# Altium footprint library microbuilder.PCBLIB: 422 footprints (part 24 of 27)
Each footprint in its own frame and in the unit in brackets; x right, y up, seen from the top. Pads: shape width x height; smd on the part's side, far side on the other; paste and mask are expansions set on the pad; w line width, h text height; cw(c..) or ccw(c..) is an arc to the next point about the centre after c.
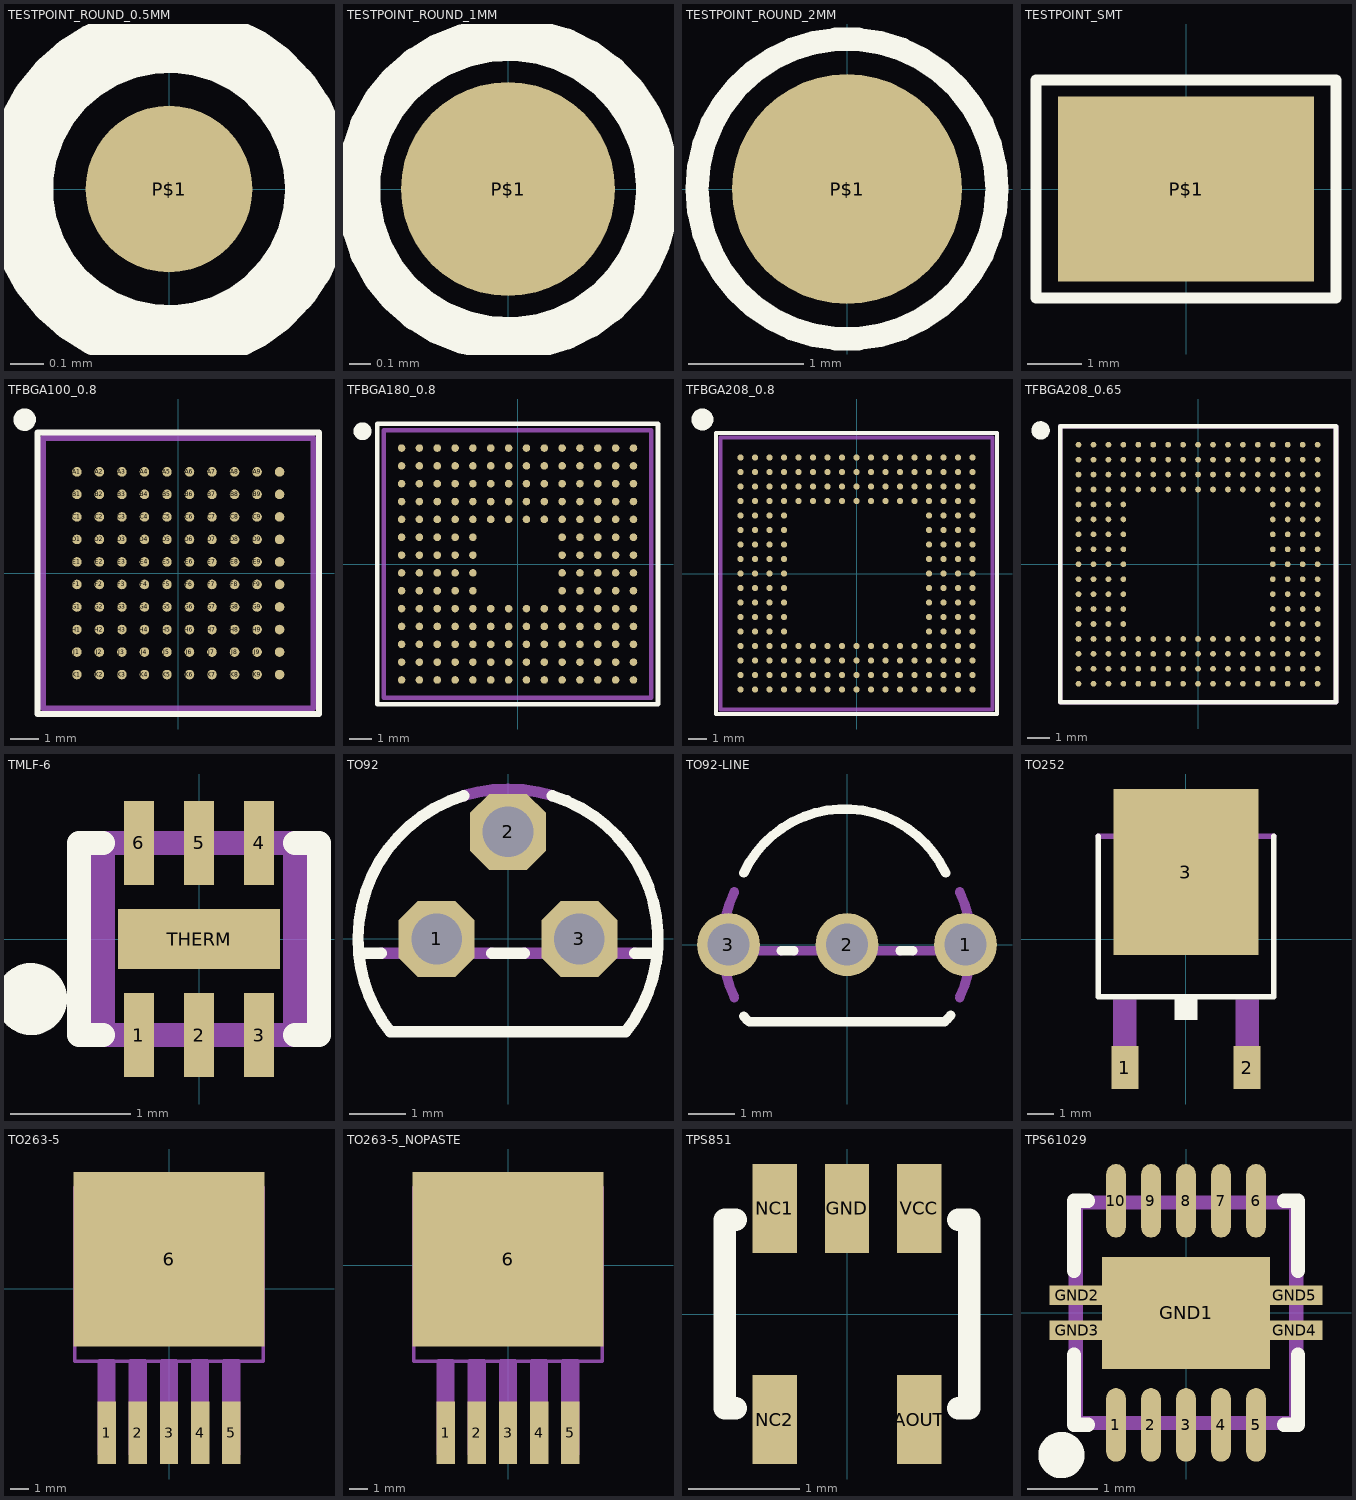
[diagram p23: the footprints below, top view; thin cyan lines are the x and y axes]

## TESTPOINT_ROUND_0.5MM [mm]
pads (1):
  rrect100% 0.5x0.5 smd: P$1(0,0)
Top Overlay:
  circle w0.203: c0,0 r0.45

## TESTPOINT_ROUND_1MM [mm]
pads (1):
  rrect100% 1x1 smd: P$1(0,0)
Top Overlay:
  circle w0.203: c0,0 r0.7

## TESTPOINT_ROUND_2MM [mm]
pads (1):
  rrect100% 2x2 smd: P$1(0,0)
Top Overlay:
  circle w0.203: c0,0 r1.303

## TESTPOINT_SMT [mm]
pads (1):
  rect 4.7x3.4 smd: P$1(0,0)
Top Overlay:
  lines w0.203: -2.75,-2 -2.75,2 2.75,2 2.75,-2 -2.75,-2

## TFBGA100_0.8 [mm]
pads (100):
  rrect100% 0.34x0.34 smd: A1(-3.6,3.6) A2(-2.8,3.6) A3(-2,3.6) A4(-1.2,3.6) A5(-0.4,3.6) A6(0.4,3.6) A7(1.2,3.6) A8(2,3.6) A9(2.8,3.6) A10(3.6,3.6) B1(-3.6,2.8) B2(-2.8,2.8) B3(-2,2.8) B4(-1.2,2.8) B5(-0.4,2.8) B6(0.4,2.8) B7(1.2,2.8) B8(2,2.8) B9(2.8,2.8) B10(3.6,2.8) C1(-3.6,2) C2(-2.8,2) C3(-2,2) C4(-1.2,2) C5(-0.4,2) C6(0.4,2) C7(1.2,2) C8(2,2) C9(2.8,2) C10(3.6,2) D1(-3.6,1.2) D2(-2.8,1.2) D3(-2,1.2) D4(-1.2,1.2) D5(-0.4,1.2) D6(0.4,1.2) D7(1.2,1.2) D8(2,1.2) D9(2.8,1.2) D10(3.6,1.2) E1(-3.6,0.4) E2(-2.8,0.4) E3(-2,0.4) E4(-1.2,0.4) E5(-0.4,0.4) E6(0.4,0.4) E7(1.2,0.4) E8(2,0.4) E9(2.8,0.4) E10(3.6,0.4) F1(-3.6,-0.4) F2(-2.8,-0.4) F3(-2,-0.4) F4(-1.2,-0.4) F5(-0.4,-0.4) F6(0.4,-0.4) F7(1.2,-0.4) F8(2,-0.4) F9(2.8,-0.4) F10(3.6,-0.4) G1(-3.6,-1.2) G2(-2.8,-1.2) G3(-2,-1.2) G4(-1.2,-1.2) G5(-0.4,-1.2) G6(0.4,-1.2) G7(1.2,-1.2) G8(2,-1.2) G9(2.8,-1.2) G10(3.6,-1.2) H1(-3.6,-2) H2(-2.8,-2) H3(-2,-2) H4(-1.2,-2) H5(-0.4,-2) H6(0.4,-2) H7(1.2,-2) H8(2,-2) H9(2.8,-2) H10(3.6,-2) J1(-3.6,-2.8) J2(-2.8,-2.8) J3(-2,-2.8) J4(-1.2,-2.8) J5(-0.4,-2.8) J6(0.4,-2.8) J7(1.2,-2.8) J8(2,-2.8) J9(2.8,-2.8) J10(3.6,-2.8) K1(-3.6,-3.6) K2(-2.8,-3.6) K3(-2,-3.6) K4(-1.2,-3.6) K5(-0.4,-3.6) K6(0.4,-3.6) K7(1.2,-3.6) K8(2,-3.6) K9(2.8,-3.6) K10(3.6,-3.6)
Top Overlay:
  circle w0.4: c-5.454,5.454 r0.2
  lines w0.203: -5,-5 -5,5 5,5 5,-5 -5,-5
Mechanical 14:
  text "A" at -5.55,3.45 h0.63
  text "1" at -3.8,5.4 h0.63
  text "B" at -5.55,2.65 h0.63
  text "C" at -5.55,1.85 h0.63
  text "D" at -5.55,1.05 h0.63
  text "E" at -5.55,0.25 h0.63
  text "F" at -5.55,-0.55 h0.63
  text "G" at -5.55,-1.35 h0.63
  text "H" at -5.55,-2.15 h0.63
  text "J" at -5.55,-2.95 h0.63
  text "K" at -5.55,-3.75 h0.63
  text "2" at -3,5.4 h0.63
  text "3" at -2.2,5.4 h0.63
  text "4" at -1.4,5.4 h0.63
  text "5" at -0.6,5.4 h0.63
  text "6" at 0.2,5.4 h0.63
  text "7" at 1,5.4 h0.63
  text "8" at 1.8,5.4 h0.63
  text "9" at 2.6,5.4 h0.63
  text "10" at 3.4,5.4 h0.63
Mechanical 16:
  lines w0.203: -4.8,-4.8 -4.8,4.8 4.8,4.8 4.8,-4.8 -4.8,-4.8

## TFBGA180_0.8 [mm]
pads (180):
  rrect100% 0.34x0.34 smd: A1(-5.2,5.2) A2(-4.4,5.2) A3(-3.6,5.2) A4(-2.8,5.2) A5(-2,5.2) A6(-1.2,5.2) A7(-0.4,5.2) A8(0.4,5.2) A9(1.2,5.2) A10(2,5.2) A11(2.8,5.2) A12(3.6,5.2) A13(4.4,5.2) A14(5.2,5.2) B1(-5.2,4.4) B2(-4.4,4.4) B3(-3.6,4.4) B4(-2.8,4.4) B5(-2,4.4) B6(-1.2,4.4) B7(-0.4,4.4) B8(0.4,4.4) B9(1.2,4.4) B10(2,4.4) B11(2.8,4.4) B12(3.6,4.4) B13(4.4,4.4) B14(5.2,4.4) C1(-5.2,3.6) C2(-4.4,3.6) C3(-3.6,3.6) C4(-2.8,3.6) C5(-2,3.6) C6(-1.2,3.6) C7(-0.4,3.6) C8(0.4,3.6) C9(1.2,3.6) C10(2,3.6) C11(2.8,3.6) C12(3.6,3.6) C13(4.4,3.6) C14(5.2,3.6) D1(-5.2,2.8) D2(-4.4,2.8) D3(-3.6,2.8) D4(-2.8,2.8) D5(-2,2.8) D6(-1.2,2.8) D7(-0.4,2.8) D8(0.4,2.8) D9(1.2,2.8) D10(2,2.8) D11(2.8,2.8) D12(3.6,2.8) D13(4.4,2.8) D14(5.2,2.8) E1(-5.2,2) E2(-4.4,2) E3(-3.6,2) E4(-2.8,2) E5(-2,2) E6(-1.2,2) E7(-0.4,2) E8(0.4,2) E9(1.2,2) E10(2,2) E11(2.8,2) E12(3.6,2) E13(4.4,2) E14(5.2,2) F1(-5.2,1.2) F2(-4.4,1.2) F3(-3.6,1.2) F4(-2.8,1.2) F5(-2,1.2) F10(2,1.2) F11(2.8,1.2) F12(3.6,1.2) F13(4.4,1.2) F14(5.2,1.2) G1(-5.2,0.4) G2(-4.4,0.4) G3(-3.6,0.4) G4(-2.8,0.4) G5(-2,0.4) G10(2,0.4) G11(2.8,0.4) G12(3.6,0.4) G13(4.4,0.4) G14(5.2,0.4) H1(-5.2,-0.4) H2(-4.4,-0.4) H3(-3.6,-0.4) H4(-2.8,-0.4) H5(-2,-0.4) H10(2,-0.4) H11(2.8,-0.4) H12(3.6,-0.4) H13(4.4,-0.4) H14(5.2,-0.4) J1(-5.2,-1.2) J2(-4.4,-1.2) J3(-3.6,-1.2) J4(-2.8,-1.2) J5(-2,-1.2) J10(2,-1.2) J11(2.8,-1.2) J12(3.6,-1.2) J13(4.4,-1.2) J14(5.2,-1.2) K1(-5.2,-2) K2(-4.4,-2) K3(-3.6,-2) K4(-2.8,-2) K5(-2,-2) K6(-1.2,-2) K7(-0.4,-2) K8(0.4,-2) K9(1.2,-2) K10(2,-2) K11(2.8,-2) K12(3.6,-2) K13(4.4,-2) K14(5.2,-2) L1(-5.2,-2.8) L2(-4.4,-2.8) L3(-3.6,-2.8) L4(-2.8,-2.8) L5(-2,-2.8) L6(-1.2,-2.8) L7(-0.4,-2.8) L8(0.4,-2.8) L9(1.2,-2.8) L10(2,-2.8) L11(2.8,-2.8) L12(3.6,-2.8) L13(4.4,-2.8) L14(5.2,-2.8) M1(-5.2,-3.6) M2(-4.4,-3.6) M3(-3.6,-3.6) M4(-2.8,-3.6) M5(-2,-3.6) M6(-1.2,-3.6) M7(-0.4,-3.6) M8(0.4,-3.6) M9(1.2,-3.6) M10(2,-3.6) M11(2.8,-3.6) M12(3.6,-3.6) M13(4.4,-3.6) M14(5.2,-3.6) N1(-5.2,-4.4) N2(-4.4,-4.4) N3(-3.6,-4.4) N4(-2.8,-4.4) N5(-2,-4.4) N6(-1.2,-4.4) N7(-0.4,-4.4) N8(0.4,-4.4) N9(1.2,-4.4) N10(2,-4.4) N11(2.8,-4.4) N12(3.6,-4.4) N13(4.4,-4.4) N14(5.2,-4.4) P1(-5.2,-5.2) P2(-4.4,-5.2) P3(-3.6,-5.2) P4(-2.8,-5.2) P5(-2,-5.2) P6(-1.2,-5.2) P7(-0.4,-5.2) P8(0.4,-5.2) P9(1.2,-5.2) P10(2,-5.2) P11(2.8,-5.2) P12(3.6,-5.2) P13(4.4,-5.2) P14(5.2,-5.2)
Top Overlay:
  circle w0.4: c-6.954,5.954 r0.2
  lines w0.203: -6.3,-6.3 6.3,-6.3 6.3,6.3 -6.3,6.3 -6.3,-6.3
Mechanical 14:
  text "A" at -6.8,5 h0.63
  text "B" at -6.8,4.2 h0.63
  text "C" at -6.8,3.4 h0.63
  text "D" at -6.8,2.6 h0.63
  text "E" at -6.8,1.8 h0.63
  text "F" at -6.8,1 h0.63
  text "G" at -6.8,0.2 h0.63
  text "H" at -6.8,-0.6 h0.63
  text "J" at -6.8,-1.4 h0.63
  text "K" at -6.8,-2.2 h0.63
  text "L" at -6.8,-3 h0.63
  text "M" at -6.8,-3.8 h0.63
  text "N" at -6.8,-4.6 h0.63
  text "P" at -6.8,-5.4 h0.63
  text "1" at -5.4,6.4 h0.63
  text "2" at -4.6,6.4 h0.63
  text "3" at -3.8,6.4 h0.63
  text "4" at -3,6.4 h0.63
  text "5" at -2.2,6.4 h0.63
  text "6" at -1.4,6.4 h0.63
  text "7" at -0.6,6.4 h0.63
  text "8" at 0.2,6.4 h0.63
  text "9" at 1,6.4 h0.63
  text "10" at 1.8,6.4 h0.63
  text "11" at 2.6,6.4 h0.63
  text "12" at 3.4,6.4 h0.63
  text "13" at 4.2,6.4 h0.63
  text "14" at 5,6.4 h0.63
Mechanical 16:
  lines w0.203: -6,-6 6,-6 6,6 -6,6 -6,-6

## TFBGA208_0.8 [mm]
pads (208):
  rrect100% 0.34x0.34 smd: A1(-6.4,6.4) A2(-5.6,6.4) A3(-4.8,6.4) A4(-4,6.4) A5(-3.2,6.4) A6(-2.4,6.4) A7(-1.6,6.4) A8(-0.8,6.4) A9(0,6.4) A10(0.8,6.4) A11(1.6,6.4) A12(2.4,6.4) A13(3.2,6.4) A14(4,6.4) A15(4.8,6.4) A16(5.6,6.4) A17(6.4,6.4) B1(-6.4,5.6) B2(-5.6,5.6) B3(-4.8,5.6) B4(-4,5.6) B5(-3.2,5.6) B6(-2.4,5.6) B7(-1.6,5.6) B8(-0.8,5.6) B9(0,5.6) B10(0.8,5.6) B11(1.6,5.6) B12(2.4,5.6) B13(3.2,5.6) B14(4,5.6) B15(4.8,5.6) B16(5.6,5.6) B17(6.4,5.6) C1(-6.4,4.8) C2(-5.6,4.8) C3(-4.8,4.8) C4(-4,4.8) C5(-3.2,4.8) C6(-2.4,4.8) C7(-1.6,4.8) C8(-0.8,4.8) C9(0,4.8) C10(0.8,4.8) C11(1.6,4.8) C12(2.4,4.8) C13(3.2,4.8) C14(4,4.8) C15(4.8,4.8) C16(5.6,4.8) C17(6.4,4.8) D1(-6.4,4) D2(-5.6,4) D3(-4.8,4) D4(-4,4) D5(-3.2,4) D6(-2.4,4) D7(-1.6,4) D8(-0.8,4) D9(0,4) D10(0.8,4) D11(1.6,4) D12(2.4,4) D13(3.2,4) D14(4,4) D15(4.8,4) D16(5.6,4) D17(6.4,4) E1(-6.4,3.2) E2(-5.6,3.2) E3(-4.8,3.2) E4(-4,3.2) E14(4,3.2) E15(4.8,3.2) E16(5.6,3.2) E17(6.4,3.2) F1(-6.4,2.4) F2(-5.6,2.4) F3(-4.8,2.4) F4(-4,2.4) F14(4,2.4) F15(4.8,2.4) F16(5.6,2.4) F17(6.4,2.4) G1(-6.4,1.6) G2(-5.6,1.6) G3(-4.8,1.6) G4(-4,1.6) G14(4,1.6) G15(4.8,1.6) G16(5.6,1.6) G17(6.4,1.6) H1(-6.4,0.8) H2(-5.6,0.8) H3(-4.8,0.8) H4(-4,0.8) H14(4,0.8) H15(4.8,0.8) H16(5.6,0.8) H17(6.4,0.8) J1(-6.4,0) J2(-5.6,0) J3(-4.8,0) J4(-4,0) J14(4,0) J15(4.8,0) J16(5.6,0) J17(6.4,0) K1(-6.4,-0.8) K2(-5.6,-0.8) K3(-4.8,-0.8) K4(-4,-0.8) K14(4,-0.8) K15(4.8,-0.8) K16(5.6,-0.8) K17(6.4,-0.8) L1(-6.4,-1.6) L2(-5.6,-1.6) L3(-4.8,-1.6) L4(-4,-1.6) L14(4,-1.6) L15(4.8,-1.6) L16(5.6,-1.6) L17(6.4,-1.6) M1(-6.4,-2.4) M2(-5.6,-2.4) M3(-4.8,-2.4) M4(-4,-2.4) M14(4,-2.4) M15(4.8,-2.4) M16(5.6,-2.4) M17(6.4,-2.4) N1(-6.4,-3.2) N2(-5.6,-3.2) N3(-4.8,-3.2) N4(-4,-3.2) N14(4,-3.2) N15(4.8,-3.2) N16(5.6,-3.2) N17(6.4,-3.2) P1(-6.4,-4) P2(-5.6,-4) P3(-4.8,-4) P4(-4,-4) P5(-3.2,-4) P6(-2.4,-4) P7(-1.6,-4) P8(-0.8,-4) P9(0,-4) P10(0.8,-4) P11(1.6,-4) P12(2.4,-4) P13(3.2,-4) P14(4,-4) P15(4.8,-4) P16(5.6,-4) P17(6.4,-4) R1(-6.4,-4.8) R2(-5.6,-4.8) R3(-4.8,-4.8) R4(-4,-4.8) R5(-3.2,-4.8) R6(-2.4,-4.8) R7(-1.6,-4.8) R8(-0.8,-4.8) R9(0,-4.8) R10(0.8,-4.8) R11(1.6,-4.8) R12(2.4,-4.8) R13(3.2,-4.8) R14(4,-4.8) R15(4.8,-4.8) R16(5.6,-4.8) R17(6.4,-4.8) T1(-6.4,-5.6) T2(-5.6,-5.6) T3(-4.8,-5.6) T4(-4,-5.6) T5(-3.2,-5.6) T6(-2.4,-5.6) T7(-1.6,-5.6) T8(-0.8,-5.6) T9(0,-5.6) T10(0.8,-5.6) T11(1.6,-5.6) T12(2.4,-5.6) T13(3.2,-5.6) T14(4,-5.6) T15(4.8,-5.6) T16(5.6,-5.6) T17(6.4,-5.6) U1(-6.4,-6.4) U2(-5.6,-6.4) U3(-4.8,-6.4) U4(-4,-6.4) U5(-3.2,-6.4) U6(-2.4,-6.4) U7(-1.6,-6.4) U8(-0.8,-6.4) U9(0,-6.4) U10(0.8,-6.4) U11(1.6,-6.4) U12(2.4,-6.4) U13(3.2,-6.4) U14(4,-6.4) U15(4.8,-6.4) U16(5.6,-6.4) U17(6.4,-6.4)
Top Overlay:
  circle w0.61: c-8.5,8.5 r0.3
  lines w0.203: -7.75,-7.75 -7.75,7.75 7.75,7.75 7.75,-7.75 -7.75,-7.75
Mechanical 16:
  lines w0.203: -7.5,-7.5 -7.5,7.5 7.5,7.5 7.5,-7.5 -7.5,-7.5

## TFBGA208_0.65 [mm]
pads (208):
  rrect100% 0.25x0.25 smd: 15(3.9,-1.95) A1(-5.2,5.2) A2(-4.55,5.2) A3(-3.9,5.2) A4(-3.25,5.2) A5(-2.6,5.2) A6(-1.95,5.2) A7(-1.3,5.2) A8(-0.65,5.2) A9(0,5.2) A10(0.65,5.2) A11(1.3,5.2) A12(1.95,5.2) A13(2.6,5.2) A14(3.25,5.2) A15(3.9,5.2) A16(4.55,5.2) A17(5.2,5.2) B1(-5.2,4.55) B2(-4.55,4.55) B3(-3.9,4.55) B4(-3.25,4.55) B5(-2.6,4.55) B6(-1.95,4.55) B7(-1.3,4.55) B8(-0.65,4.55) B9(0,4.55) B10(0.65,4.55) B11(1.3,4.55) B12(1.95,4.55) B13(2.6,4.55) B14(3.25,4.55) B15(3.9,4.55) B16(4.55,4.55) B17(5.2,4.55) C1(-5.2,3.9) C2(-4.55,3.9) C3(-3.9,3.9) C4(-3.25,3.9) C5(-2.6,3.9) C6(-1.95,3.9) C7(-1.3,3.9) C8(-0.65,3.9) C9(0,3.9) C10(0.65,3.9) C11(1.3,3.9) C12(1.95,3.9) C13(2.6,3.9) C14(3.25,3.9) C15(3.9,3.9) C16(4.55,3.9) C17(5.2,3.9) D1(-5.2,3.25) D2(-4.55,3.25) D3(-3.9,3.25) D4(-3.25,3.25) D5(-2.6,3.25) D6(-1.95,3.25) D7(-1.3,3.25) D8(-0.65,3.25) D9(0,3.25) D10(0.65,3.25) D11(1.3,3.25) D12(1.95,3.25) D13(2.6,3.25) D14(3.25,3.25) D15(3.9,3.25) D16(4.55,3.25) D17(5.2,3.25) E1(-5.2,2.6) E2(-4.55,2.6) E3(-3.9,2.6) E4(-3.25,2.6) E14(3.25,2.6) E15(3.9,2.6) E16(4.55,2.6) E17(5.2,2.6) F1(-5.2,1.95) F2(-4.55,1.95) F3(-3.9,1.95) F4(-3.25,1.95) F14(3.25,1.95) F15(3.9,1.95) F16(4.55,1.95) F17(5.2,1.95) G1(-5.2,1.3) G2(-4.55,1.3) G3(-3.9,1.3) G4(-3.25,1.3) G14(3.25,1.3) G15(3.9,1.3) G16(4.55,1.3) G17(5.2,1.3) H1(-5.2,0.65) H2(-4.55,0.65) H3(-3.9,0.65) H4(-3.25,0.65) H14(3.25,0.65) H15(3.9,0.65) H16(4.55,0.65) H17(5.2,0.65) J1(-5.2,0) J2(-4.55,0) J3(-3.9,0) J4(-3.25,0) J14(3.25,0) J15(3.9,0) J16(4.55,0) J17(5.2,0) K1(-5.2,-0.65) K1'(3.25,-0.65) K2(-4.55,-0.65) K3(-3.9,-0.65) K4(-3.25,-0.65) K15(3.9,-0.65) K16(4.55,-0.65) K17(5.2,-0.65) L1(-5.2,-1.3) L2(-4.55,-1.3) L3(-3.9,-1.3) L4(-3.25,-1.3) L14(3.25,-1.3) L15(3.9,-1.3) L16(4.55,-1.3) L17(5.2,-1.3) M1(-5.2,-1.95) M2(-4.55,-1.95) M3(-3.9,-1.95) M4(-3.25,-1.95) M14(3.25,-1.95) M16(4.55,-1.95) M17(5.2,-1.95) N1(-5.2,-2.6) N2(-4.55,-2.6) N3(-3.9,-2.6) N4(-3.25,-2.6) N14(3.25,-2.6) N15(3.9,-2.6) N16(4.55,-2.6) N17(5.2,-2.6) P1(-5.2,-3.25) P2(-4.55,-3.25) P3(-3.9,-3.25) P4(-3.25,-3.25) P5(-2.6,-3.25) P6(-1.95,-3.25) P7(-1.3,-3.25) P8(-0.65,-3.25) P9(0,-3.25) P10(0.65,-3.25) P11(1.3,-3.25) P12(1.95,-3.25) P13(2.6,-3.25) P14(3.25,-3.25) P15(3.9,-3.25) P16(4.55,-3.25) P17(5.2,-3.25) R1(-5.2,-3.9) R2(-4.55,-3.9) R3(-3.9,-3.9) R4(-3.25,-3.9) R5(-2.6,-3.9) R6(-1.95,-3.9) R7(-1.3,-3.9) R8(-0.65,-3.9) R9(0,-3.9) R10(0.65,-3.9) R11(1.3,-3.9) R12(1.95,-3.9) R13(2.6,-3.9) R14(3.25,-3.9) R15(3.9,-3.9) R16(4.55,-3.9) R17(5.2,-3.9) T1(-5.2,-4.55) T2(-4.55,-4.55) T3(-3.9,-4.55) T4(-3.25,-4.55) T5(-2.6,-4.55) T6(-1.95,-4.55) T7(-1.3,-4.55) T8(-0.65,-4.55) T9(0,-4.55) T10(0.65,-4.55) T11(1.3,-4.55) T12(1.95,-4.55) T13(2.6,-4.55) T14(3.25,-4.55) T15(3.9,-4.55) T16(4.55,-4.55) T17(5.2,-4.55) U1(-5.2,-5.2) U2(-4.55,-5.2) U3(-3.9,-5.2) U4(-3.25,-5.2) U5(-2.6,-5.2) U6(-1.95,-5.2) U7(-1.3,-5.2) U8(-0.65,-5.2) U9(0,-5.2) U10(0.65,-5.2) U11(1.3,-5.2) U12(1.95,-5.2) U13(2.6,-5.2) U14(3.25,-5.2) U15(3.9,-5.2) U16(4.55,-5.2) U17(5.2,-5.2)
Top Overlay:
  circle w0.4: c-6.85,5.82 r0.2
  lines w0.203: -6,-6 -6,6 6,6 6,-6 -6,-6
Mechanical 14:
  text "17" at 4.875,6.338 h0.63
  text "16" at 4.225,6.338 h0.63
  text "15" at 3.575,6.338 h0.63
  text "14" at 2.925,6.338 h0.63
  text "13" at 2.275,6.338 h0.63
  text "12" at 1.625,6.338 h0.63
  text "11" at 0.975,6.338 h0.63
  text "10" at 0.325,6.338 h0.63
  text "9" at -0.163,6.338 h0.63
  text "8" at -0.813,6.338 h0.63
  text "7" at -1.463,6.338 h0.63
  text "6" at -2.113,6.338 h0.63
  text "5" at -2.763,6.338 h0.63
  text "4" at -3.412,6.338 h0.63
  text "3" at -4.062,6.338 h0.63
  text "2" at -4.712,6.338 h0.63
  text "1" at -5.362,6.338 h0.63
  text "U" at -6.662,-5.362 h0.63
  text "T" at -6.662,-4.712 h0.63
  text "R" at -6.662,-4.062 h0.63
  text "P" at -6.662,-3.412 h0.63
  text "N" at -6.662,-2.763 h0.63
  text "M" at -6.662,-2.113 h0.63
  text "L" at -6.662,-1.463 h0.63
  text "K" at -6.662,-0.813 h0.63
  text "J" at -6.662,-0.163 h0.63
  text "H" at -6.662,0.487 h0.63
  text "G" at -6.662,1.137 h0.63
  text "F" at -6.662,1.787 h0.63
  text "E" at -6.662,2.437 h0.63
  text "D" at -6.662,3.088 h0.63
  text "C" at -6.662,3.738 h0.63
  text "B" at -6.662,4.388 h0.63
  text "A" at -6.662,5.038 h0.63
Mechanical 16:
  lines w0.203: -6,-6 -6,6 6,6 6,-6 -6,-6

## TMLF-6 [mil]
pads (7):
  rect 9.84x27.56 smd: 1(-19.69,-31.5) 2(0,-31.5) 3(19.69,-31.5) 4(19.69,31.5) 5(0,31.5) 6(-19.69,31.5)
  rect 53.15x19.69 smd: THERM(0,0)
Top Overlay:
  circle w15.75: c-55.12,-19.69 r3.94
  lines w8: -31.5,-31.5 -39.37,-31.5 -39.37,31.5 -31.5,31.5 ; 31.5,-31.5 39.37,-31.5 39.37,31.5 31.5,31.5
Mechanical 16:
  lines w8: -31.5,-31.5 -31.5,31.5 31.5,31.5 31.5,-31.5 -31.5,-31.5

## TO92 [mm]
pads (3):
  oct 1.35x1.35 hole 0.9: 1(-1.27,0) 2(0,1.905) 3(1.27,0)
Top Overlay:
  lines w0.203: -2.254,-0.254 -2.655,-0.254 ; -0.786,2.548 ccw(c0,0) -2.655,-0.254 ; -0.286,-0.254 0.286,-0.254 ; 0.786,2.548 cw(c0,0) 2.094,-1.651 -2.094,-1.651 cw(c0,0) -2.655,-0.254 ; 2.254,-0.254 2.655,-0.254
Mechanical 16:
  lines w0.203: -2.254,-0.254 -0.286,-0.254 ; -0.786,2.548 cw(c0,0) 0.786,2.548 ; 0.286,-0.254 2.254,-0.254

## TO92-LINE [mm]
pads (3):
  round 1.35 hole 0.9: 1(2.54,0) 2(0,0) 3(-2.54,0)
Top Overlay:
  lines w0.203: -2.214,-1.536 ccw(c-1.651,-1.075) -2.095,-1.651 2.095,-1.651 ccw(c1.576,-1.037) 2.225,-1.512 ; -2.213,1.536 cw(c-0.05,0.519) 2.113,1.536 ; -1.404,-0.127 -1.136,-0.127 ; 1.136,-0.127 1.404,-0.127
Mechanical 16:
  lines w0.203: -2.413,-1.136 cw(c0,0) -2.664,-0.127 ; -2.413,1.136 ccw(c0,0) -2.664,-0.127 ; -1.404,-0.127 -2.664,-0.127 ; -1.136,-0.127 1.136,-0.127 ; 1.404,-0.127 2.664,-0.127 ; 2.413,-1.136 ccw(c0,0) 2.664,-0.127 ; 2.413,1.136 cw(c0,0) 2.664,-0.127

## TO252 [mm]
pads (3):
  rect 1x1.6 smd: 1(-2.28,-4.8) 2(2.28,-4.8)
  rect 5.4x6.2 smd: 3(0,2.5)
Top Overlay:
  rectangle: -0.432,-3.023 0.432,-2.261
  lines w0.203: -3.277,3.835 -3.277,-2.159 3.277,-2.159 3.277,3.835
Mechanical 16:
  rectangle: 1.854,-5.156 2.718,-2.261
  rectangle: -2.718,-5.156 -1.854,-2.261
  region: 0,0 0.254,0 0.254,0.254 0,0.254
  lines w0.203: -3.277,3.835 3.277,3.835 ; -2.565,3.937 2.565,3.937 2.565,4.648 2.108,5.105 -2.108,5.105 -2.565,4.648 -2.565,3.937

## TO263-5 [mm]
pads (6):
  rect 1x3.4 smd: 1(-3.4,-7.875) 2(-1.7,-7.875) 3(0,-7.875) 4(1.7,-7.875) 5(3.4,-7.875)
  rect 10.414x9.525 smd: 6(0,1.595)
Top Paste:
  rectangle: -5.08,3.81 5.08,6.35
Mechanical 16:
  rectangle: 3.048,-8.992 3.759,-3.988
  rectangle: 1.346,-9.017 2.083,-4.013
  rectangle: -0.381,-8.992 0.356,-3.988
  rectangle: -2.032,-8.992 -1.321,-3.988
  rectangle: -3.785,-9.017 -3.023,-3.988
  lines w0.203: -5.15,-3.961 5.15,-3.961 ; -5.15,-3.911 -5.15,4.839 5.15,4.839 5.15,-3.911 ; -5.15,4.844 -5.15,5.533 ; -5.131,5.537 -4.318,6.223 ; -4.287,6.236 4.287,6.236 ; -3.019,-9.028 -3.804,-9.028 -3.804,-3.948 -3.019,-3.948 ; -3.017,-9.028 -3.017,-3.948 ; -1.317,-9.028 -2.102,-9.028 -2.102,-3.948 -1.317,-3.948 ; -1.315,-9.028 -1.315,-3.948 ; 0.385,-9.028 -0.4,-9.028 -0.4,-3.948 0.385,-3.948 ; 0.387,-9.028 0.387,-3.948 ; 2.087,-9.028 1.301,-9.028 1.301,-3.948 2.087,-3.948 ; 2.089,-9.028 2.089,-3.948 ; 3.788,-9.028 3.003,-9.028 3.003,-3.948 3.788,-3.948 ; 3.791,-9.028 3.791,-3.948 ; 4.318,6.223 5.131,5.537 ; 5.15,4.844 5.15,5.533

## TO263-5_NOPASTE [mm]
pads (6):
  rect 1x3.4 smd: 1(-3.4,-9.145) 2(-1.7,-9.145) 3(0,-9.145) 4(1.7,-9.145) 5(3.4,-9.145)
  rect 10.414x9.525 smd: 6(0,0.325)
Mechanical 16:
  rectangle: 3.048,-10.262 3.759,-5.258
  rectangle: 1.346,-10.287 2.083,-5.283
  rectangle: -0.381,-10.262 0.356,-5.258
  rectangle: -2.032,-10.262 -1.321,-5.258
  rectangle: -3.785,-10.287 -3.023,-5.258
  lines w0.203: -5.15,-5.231 5.15,-5.231 ; -5.15,-5.181 -5.15,3.569 5.15,3.569 5.15,-5.181 ; -5.15,3.574 -5.15,4.263 ; -5.131,4.267 -4.318,4.953 ; -4.287,4.966 4.287,4.966 ; -3.019,-10.298 -3.804,-10.298 -3.804,-5.218 -3.019,-5.218 ; -3.017,-10.298 -3.017,-5.218 ; -1.317,-10.298 -2.102,-10.298 -2.102,-5.218 -1.317,-5.218 ; -1.315,-10.298 -1.315,-5.218 ; 0.385,-10.298 -0.4,-10.298 -0.4,-5.218 0.385,-5.218 ; 0.387,-10.298 0.387,-5.218 ; 2.087,-10.298 1.301,-10.298 1.301,-5.218 2.087,-5.218 ; 2.089,-10.298 2.089,-5.218 ; 3.788,-10.298 3.003,-10.298 3.003,-5.218 3.788,-5.218 ; 3.791,-10.298 3.791,-5.218 ; 4.318,4.953 5.131,4.267 ; 5.15,3.574 5.15,4.263

## TPS851 [mil]
pads (5):
  rect 15.75x31.5 smd: AOUT(25.59,-37.4) GND(0,37.4) NC1(-25.59,37.4) NC2(-25.59,-37.4) VCC(25.59,37.4)
Top Overlay:
  lines w8: -39.37,-33.46 -43.31,-33.46 -43.31,33.46 -39.37,33.46 ; 39.37,-33.46 43.31,-33.46 43.31,33.46 39.37,33.46

## TPS61029 [mm]
pads (15):
  rrect100% 0.28x1.05 smd: 1(-1,-1.6) 2(-0.5,-1.6) 3(0,-1.6) 4(0.5,-1.6) 5(1,-1.6) 6(1,1.6) 7(0.5,1.6) 8(0,1.6) 9(-0.5,1.6) 10(-1,1.6)
  rect 2.4x1.6 smd: GND1(0,0)
  rect 0.8x0.28 smd: GND2(-1.55,0.25) GND3(-1.55,-0.25) GND4(1.55,-0.25) GND5(1.55,0.25)
Top Overlay:
  circle w0.406: c-1.778,-2.032 r0.127
  lines w0.203: -1.6,-0.6 -1.6,-1.6 -1.4,-1.6 ; -1.6,0.6 -1.6,1.6 -1.4,1.6 ; 1.4,-1.6 1.6,-1.6 1.6,-0.6 ; 1.4,1.6 1.6,1.6 1.6,0.6
Top Paste:
  rectangle: -1.016,0.127 -0.254,0.635
  rectangle: -1.016,-0.635 -0.254,-0.127
  rectangle: 0.254,0.127 1.016,0.635
  rectangle: 0.254,-0.635 1.016,-0.127
  rectangle: -1.905,-0.381 -1.397,-0.127
  rectangle: -1.905,0.127 -1.397,0.381
  rectangle: 1.397,0.127 1.905,0.381
  rectangle: 1.397,-0.381 1.905,-0.127
Mechanical 16:
  lines w0.203: -1.575,-1.575 1.575,-1.575 1.575,1.575 -1.575,1.575 -1.575,-1.575